# Altium schematic symbol library lib_datalogger.SchLib: 1246 symbols (part 13 of 16) (continued)
## CMP-020-00000-3 (continued)
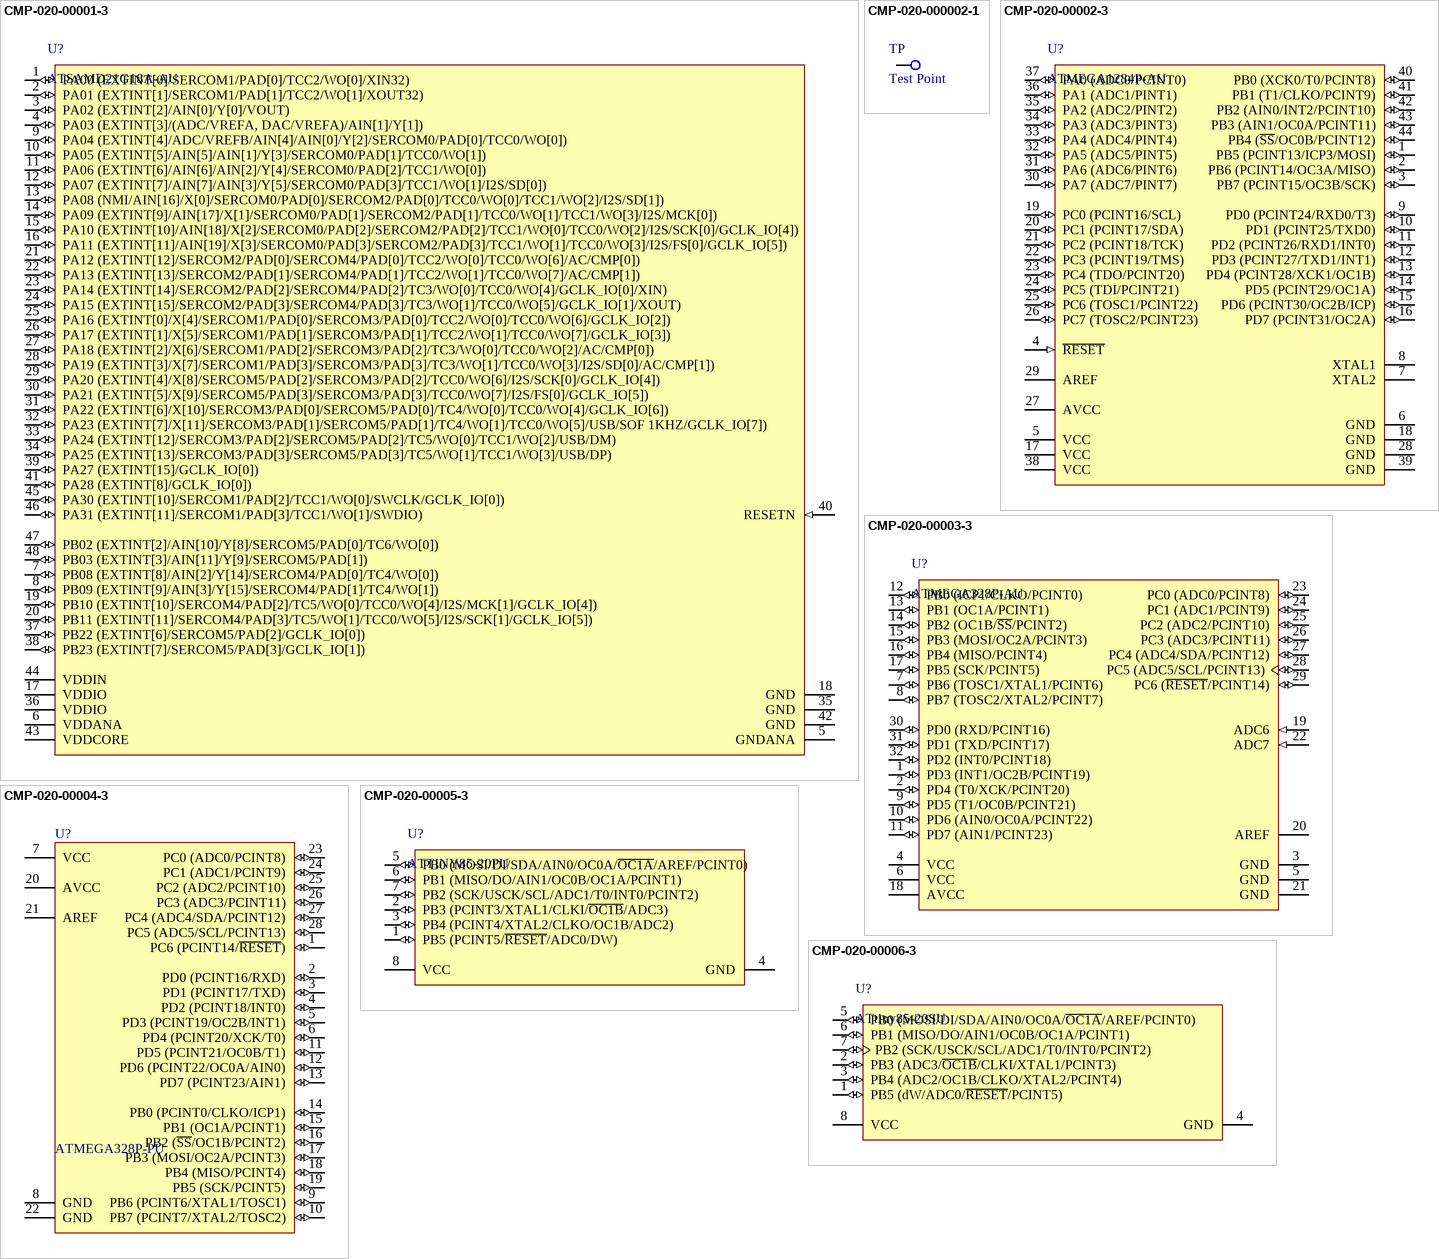
[diagram p37: symbols CMP-020-00001-3 to CMP-020-00006-3]

## CMP-020-00001-3
designator U?, comment ATSAMD21G18A-AU
SMART ARM-Based Microcontroller, 1.62 to 3.63 V, 256 KB Flash, 32 KB SRAM, -40 to 85 degC, 48-Pin TQFP, RoHS, Tray; Manufacturer: Atmel; Interface: USART; I/Os: 38; Max Supply Voltage: 3.63V; Min Supply Voltage: 1.62V; Density: 256KB; RAM Size: 32KB; Package Reference: TQFP48; Datasheet URL: http://www.atmel.com/images/atmel-42181-sam-d21_datasheet.pdf; Mounting Technology: SM; Datasheet Version: Rev. N, 10/2016; Package Description: 48-Pin Thin Profile Plastic Quad Flat Package, Body 7 x 7 mm, Pitch 0.5 mm; Case/Package: TQFP; Pins: 48; Min Operating Temperature: -40°C; Manufacturer URL: http://www.atmel.com/; Packaging: Tray; Max Operating Temperature: 85°C; RoHS Compliant: True
footprint ATML-TQFP48_N (QFP, 48-Leads, Body 7x7mm, Pitch 0.5mm, IPC Medium Density)
footprint ATML-TQFP48_M (QFP, 48-Leads, Body 7x7mm, Pitch 0.5mm, IPC Low Density)
footprint ATML-TQFP48_L (QFP, 48-Leads, Body 7x7mm, Pitch 0.5mm, IPC High Density)
pins: 1 PA00 (EXTINT[0]/SERCOM1/PAD[0]/TCC2/WO[0]/XIN32) (io), 2 PA01 (EXTINT[1]/SERCOM1/PAD[1]/TCC2/WO[1]/XOUT32) (io), 3 PA02 (EXTINT[2]/AIN[0]/Y[0]/VOUT) (io), 4 PA03 (EXTINT[3]/(ADC/VREFA, DAC/VREFA)/AIN[1]/Y[1]) (io), 5 GNDANA (power) "Ground for the analog power domain", 6 VDDANA (power) "Analog supply voltage", 7 PB08 (EXTINT[8]/AIN[2]/Y[14]/SERCOM4/PAD[0]/TC4/WO[0]) (io), 8 PB09 (EXTINT[9]/AIN[3]/Y[15]/SERCOM4/PAD[1]/TC4/WO[1]) (io), 9 PA04 (EXTINT[4]/ADC/VREFB/AIN[4]/AIN[0]/Y[2]/SERCOM0/PAD[0]/TCC0/WO[0]) (io), 10 PA05 (EXTINT[5]/AIN[5]/AIN[1]/Y[3]/SERCOM0/PAD[1]/TCC0/WO[1]) (io), 11 PA06 (EXTINT[6]/AIN[6]/AIN[2]/Y[4]/SERCOM0/PAD[2]/TCC1/WO[0]) (io), 12 PA07 (EXTINT[7]/AIN[7]/AIN[3]/Y[5]/SERCOM0/PAD[3]/TCC1/WO[1]/I2S/SD[0]) (io), 13 PA08 (NMI/AIN[16]/X[0]/SERCOM0/PAD[0]/SERCOM2/PAD[0]/TCC0/WO[0]/TCC1/WO[2]/I2S/SD[1]) (io), 14 PA09 (EXTINT[9]/AIN[17]/X[1]/SERCOM0/PAD[1]/SERCOM2/PAD[1]/TCC0/WO[1]/TCC1/WO[3]/I2S/MCK[0]) (io), 15 PA10 (EXTINT[10]/AIN[18]/X[2]/SERCOM0/PAD[2]/SERCOM2/PAD[2]/TCC1/WO[0]/TCC0/WO[2]/I2S/SCK[0]/GCLK_IO[4]) (io), 16 PA11 (EXTINT[11]/AIN[19]/X[3]/SERCOM0/PAD[3]/SERCOM2/PAD[3]/TCC1/WO[1]/TCC0/WO[3]/I2S/FS[0]/GCLK_IO[5]) (io), 17 VDDIO (power) "Digital supply voltage", 18 GND (power) "Ground", 19 PB10 (EXTINT[10]/SERCOM4/PAD[2]/TC5/WO[0]/TCC0/WO[4]/I2S/MCK[1]/GCLK_IO[4]) (io), 20 PB11 (EXTINT[11]/SERCOM4/PAD[3]/TC5/WO[1]/TCC0/WO[5]/I2S/SCK[1]/GCLK_IO[5]) (io), 21 PA12 (EXTINT[12]/SERCOM2/PAD[0]/SERCOM4/PAD[0]/TCC2/WO[0]/TCC0/WO[6]/AC/CMP[0]) (io), 22 PA13 (EXTINT[13]/SERCOM2/PAD[1]/SERCOM4/PAD[1]/TCC2/WO[1]/TCC0/WO[7]/AC/CMP[1]) (io), 23 PA14 (EXTINT[14]/SERCOM2/PAD[2]/SERCOM4/PAD[2]/TC3/WO[0]/TCC0/WO[4]/GCLK_IO[0]/XIN) (io), 24 PA15 (EXTINT[15]/SERCOM2/PAD[3]/SERCOM4/PAD[3]/TC3/WO[1]/TCC0/WO[5]/GCLK_IO[1]/XOUT) (io), 25 PA16 (EXTINT[0]/X[4]/SERCOM1/PAD[0]/SERCOM3/PAD[0]/TCC2/WO[0]/TCC0/WO[6]/GCLK_IO[2]) (io), 26 PA17 (EXTINT[1]/X[5]/SERCOM1/PAD[1]/SERCOM3/PAD[1]/TCC2/WO[1]/TCC0/WO[7]/GCLK_IO[3]) (io), 27 PA18 (EXTINT[2]/X[6]/SERCOM1/PAD[2]/SERCOM3/PAD[2]/TC3/WO[0]/TCC0/WO[2]/AC/CMP[0]) (io), 28 PA19 (EXTINT[3]/X[7]/SERCOM1/PAD[3]/SERCOM3/PAD[3]/TC3/WO[1]/TCC0/WO[3]/I2S/SD[0]/AC/CMP[1]) (io), 29 PA20 (EXTINT[4]/X[8]/SERCOM5/PAD[2]/SERCOM3/PAD[2]/TCC0/WO[6]/I2S/SCK[0]/GCLK_IO[4]) (io), 30 PA21 (EXTINT[5]/X[9]/SERCOM5/PAD[3]/SERCOM3/PAD[3]/TCC0/WO[7]/I2S/FS[0]/GCLK_IO[5]) (io), 31 PA22 (EXTINT[6]/X[10]/SERCOM3/PAD[0]/SERCOM5/PAD[0]/TC4/WO[0]/TCC0/WO[4]/GCLK_IO[6]) (io), 32 PA23 (EXTINT[7]/X[11]/SERCOM3/PAD[1]/SERCOM5/PAD[1]/TC4/WO[1]/TCC0/WO[5]/USB/SOF 1KHZ/GCLK_IO[7]) (io), 33 PA24 (EXTINT[12]/SERCOM3/PAD[2]/SERCOM5/PAD[2]/TC5/WO[0]/TCC1/WO[2]/USB/DM) (io), 34 PA25 (EXTINT[13]/SERCOM3/PAD[3]/SERCOM5/PAD[3]/TC5/WO[1]/TCC1/WO[3]/USB/DP) (io), 35 GND (power) "Ground", 36 VDDIO (power) "Digital supply voltage", 37 PB22 (EXTINT[6]/SERCOM5/PAD[2]/GCLK_IO[0]) (io), 38 PB23 (EXTINT[7]/SERCOM5/PAD[3]/GCLK_IO[1]) (io), 39 PA27 (EXTINT[15]/GCLK_IO[0]) (io), 40 RESETN (in) "Reset pin", 41 PA28 (EXTINT[8]/GCLK_IO[0]) (io), 42 GND (power) "Ground", 43 VDDCORE (power) "Core supply voltage / external decoupling pin", 44 VDDIN (power), 45 PA30 (EXTINT[10]/SERCOM1/PAD[2]/TCC1/WO[0]/SWCLK/GCLK_IO[0]) (io), 46 PA31 (EXTINT[11]/SERCOM1/PAD[3]/TCC1/WO[1]/SWDIO) (io), 47 PB02 (EXTINT[2]/AIN[10]/Y[8]/SERCOM5/PAD[0]/TC6/WO[0]) (io), 48 PB03 (EXTINT[3]/AIN[11]/Y[9]/SERCOM5/PAD[1]) (io)

## CMP-020-000002-1
designator TP, comment Test Point
Pad Test Point
footprint Test Point-Footprint-1
pins: 1

## CMP-020-00002-3
designator U?, comment ATMEGA1284P-AU
8-Bit Microcontroller with 128 KBytes In-System Programmable Flash, 32 I/Os, -40 to 85 degC, 44-Pin TQFP (44A), RoHS, Tray; Manufacturer: Atmel; Density: 128KB; Frequency: 20MHz; RAM Size: 16KB; PWM Channels: 6; USB Channels: 0; I/Os: 32; Min Supply Voltage: 1.8V; Max Supply Voltage: 5.5V; Interface: USART; ADC Channels: 8; Pins: 8; Manufacturer URL: http://www.atmel.com/; Case/Package: TQFP; Max Operating Temperature: 85°C; Package Description: 44-Pin Quad Flat Package, Body 10 x 10 mm, Pitch 0.8 mm; Mounting Technology: SM; Package Reference: 44A; Min Operating Temperature: -40°C; Clock Frequency: 20MHz; Datasheet Version: Rev. 8272G, 01/2015; Package Quantity: 160; Ethernet Channels: 0; Packaging: Tray; Datasheet URL: http://www.atmel.com/images/atmel-8272-8-bit-avr-microcontroller-atmega164a_pa-324a_pa-644a_pa-1284_p_summary.pdf; Max Clock Frequency: 20MHz; RoHS Compliant: True
footprint ATML-44A_L (TQFP, 44-Leads, Body 10x10mm, Pitch 0.8mm, IPC High Density)
footprint ATML-44A_M (TQFP, 44-Leads, Body 10x10mm, Pitch 0.8mm, IPC Low Density)
footprint ATML-44A_N (TQFP, 44-Leads, Body 10x10mm, Pitch 0.8mm, IPC Medium Density)
pins: 1 PB5 (PCINT13/ICP3/MOSI) (io), 2 PB6 (PCINT14/OC3A/MISO) (io), 3 PB7 (PCINT15/OC3B/SCK) (io), 4 ~{RESET} (in) "Reset input.", 5 VCC (power) "Digital supply voltage.", 6 GND (power) "Ground.", 7 XTAL2 "Output from the inverting Oscillator amplifier.", 8 XTAL1 "Input to the inverting Oscillator amplifier and input to the internal clock operating circuit.", 9 PD0 (PCINT24/RXD0/T3) (io), 10 PD1 (PCINT25/TXD0) (io), 11 PD2 (PCINT26/RXD1/INT0) (io), 12 PD3 (PCINT27/TXD1/INT1) (io), 13 PD4 (PCINT28/XCK1/OC1B) (io), 14 PD5 (PCINT29/OC1A) (io), 15 PD6 (PCINT30/OC2B/ICP) (io), 16 PD7 (PCINT31/OC2A) (io), 17 VCC (power) "Digital supply voltage.", 18 GND (power) "Ground.", 19 PC0 (PCINT16/SCL) (io), 20 PC1 (PCINT17/SDA) (io), 21 PC2 (PCINT18/TCK) (io), 22 PC3 (PCINT19/TMS) (io), 23 PC4 (TDO/PCINT20) (io), 24 PC5 (TDI/PCINT21) (io), 25 PC6 (TOSC1/PCINT22) (io), 26 PC7 (TOSC2/PCINT23) (io), 27 AVCC (power) "AVCC is the supply voltage pin for Port A and the Analog-to-digital Converter.", 28 GND (power) "Ground.", 29 AREF "This is the analog reference pin for the Analog-to-digital Converter.", 30 PA7 (ADC7/PINT7) (io), 31 PA6 (ADC6/PINT6) (io), 32 PA5 (ADC5/PINT5) (io), 33 PA4 (ADC4/PINT4) (io), 34 PA3 (ADC3/PINT3) (io), 35 PA2 (ADC2/PINT2) (io), 36 PA1 (ADC1/PINT1) (io), 37 PA0 (ADC0/PCINT0) (io), 38 VCC (power) "Digital supply voltage.", 39 GND (power) "Ground.", 40 PB0 (XCK0/T0/PCINT8) (io), 41 PB1 (T1/CLKO/PCINT9) (io), 42 PB2 (AIN0/INT2/PCINT10) (io), 43 PB3 (AIN1/OC0A/PCINT11) (io), 44 PB4 (~{SS}/OC0B/PCINT12) (io)

## CMP-020-00003-3
designator U?, comment ATMEGA328P-AU
8-Bit Microcontroller with 32 KBytes In-System Programmable Flash, 23 I/Os, -40 to 85 degC, 32-Pin TQFP (32A), RoHS, Tray; Manufacturer: Atmel; PWM Channels: 6; Frequency: 20MHz; RAM Size: 2KB; ADC Channels: 8; Max Supply Voltage: 5.5V; Density: 32KB; USB Channels: 0; I/Os: 23; Min Supply Voltage: 1.8V; Interface: USART; Package Reference: 32A; Package Description: 32-Pin Thin Profile Plastic Quad Flat Package, Body 7 x 7 mm, Pitch 0.8 mm; Max Operating Temperature: 85°C; Mounting Technology: SM; Datasheet URL: http://www.atmel.com/images/Atmel-8271-8-bit-AVR-Microcontroller-ATmega48A-48PA-88A-88PA-168A-168PA-328-328P_datasheet_Complete.pdf; Pins: 32; Packaging: Tray; RoHS Compliant: True; Max Clock Frequency: 20MHz; Ethernet Channels: 0; Clock Frequency: 20MHz; Case/Package: TQFP; Manufacturer URL: http://www.atmel.com/; Datasheet Version: Rev. 8271J, 11/2015; Package Quantity: 250; Min Operating Temperature: -40°C
footprint ATML-32A_M (TQFP, 32-Leads, Body 7x7mm, Pitch 0.8mm, IPC Low Density)
footprint ATML-32A_N (TQFP, 32-Leads, Body 7x7mm, Pitch 0.8mm, IPC Medium Density)
footprint ATML-32A_L (TQFP, 32-Leads, Body 7x7mm, Pitch 0.8mm, IPC High Density)
pins: 1 PD3 (INT1/OC2B/PCINT19) (io), 2 PD4 (T0/XCK/PCINT20) (io), 3 GND (power) "Ground.", 4 VCC (power) "Digital supply voltage.", 5 GND (power) "Ground.", 6 VCC (power) "Digital supply voltage.", 7 PB6 (TOSC1/XTAL1/PCINT6) (io), 8 PB7 (TOSC2/XTAL2/PCINT7) (io), 9 PD5 (T1/OC0B/PCINT21) (io), 10 PD6 (AIN0/OC0A/PCINT22) (io), 11 PD7 (AIN1/PCINT23) (io), 12 PB0 (ICP1/CLKO/PCINT0) (io), 13 PB1 (OC1A/PCINT1) (io), 14 PB2 (OC1B/~{SS}/PCINT2) (io), 15 PB3 (MOSI/OC2A/PCINT3) (io), 16 PB4 (MISO/PCINT4) (io), 17 PB5 (SCK/PCINT5) (io), 18 AVCC (power) "AVCC is the supply voltage pin for the A/D Converter, PC3:0, and ADC7:6. It should be externally connected to VCC, even if the ADC is not used. If the ADC is used, it should be connected to VCC through a low-pass filter. (See Datasheet)", 19 ADC6 (in) "In the TQFP and QFN/MLF package, ADC7:6 serve as analog inputs to the A/D converter.These pins are powered from the analog supply and serve as 10-bit ADC channels.", 20 AREF "AREF is the analog reference pin for the A/D Converter.", 21 GND (power) "Ground.", 22 ADC7 (in) "In the TQFP and QFN/MLF package, ADC7:6 serve as analog inputs to the A/D converter.These pins are powered from the analog supply and serve as 10-bit ADC channels.", 23 PC0 (ADC0/PCINT8) (io), 24 PC1 (ADC1/PCINT9) (io), 25 PC2 (ADC2/PCINT10) (io), 26 PC3 (ADC3/PCINT11) (io), 27 PC4 (ADC4/SDA/PCINT12) (io), 28 PC5 (ADC5/SCL/PCINT13) (io), 29 PC6 (~{RESET}/PCINT14) (io), 30 PD0 (RXD/PCINT16) (io), 31 PD1 (TXD/PCINT17) (io), 32 PD2 (INT0/PCINT18) (io)

## CMP-020-00004-3
designator U?, comment ATMEGA328P-PU
8-Bit Microcontroller with 32 KBytes In-System Programmable Flash, 23 I/Os, -40 to 85 degC, 28-Pin PDIP (28P3), RoHS, Tube; Manufacturer: Atmel; I/Os: 23; Density: 32KB; Package Version: Rev. B, 09/2001; Max Clock Frequency: 20MHz; Interface: USART; Max Supply Voltage: 5.5V; Min Supply Voltage: 1.8V; Ethernet Channels: 0; RAM Size: 2KB; RoHS Compliant: True; Datasheet URL: http://www.atmel.com/images/Atmel-8271-8-bit-AVR-Microcontroller-ATmega48A-48PA-88A-88PA-168A-168PA-328-328P_datasheet_Complete.pdf; Packaging: Rail/Tube; Manufacturer URL: http://www.atmel.com/; Mounting Technology: TH; Package URL: http://www.atmel.com/images/Atmel-8271-8-bit-AVR-Microcontroller-ATmega48A-48PA-88A-88PA-168A-168PA-328-328P_datasheet_Complete.pdf; Datasheet Version: Rev. 8271J, 11/2015; Package Description: 28-Pin Plastic Dual Inline Package, Body 34.671 x 7.3025 mm, Pitch 2.54 mm; Package Quantity: 14; Min Operating Temperature: -40°C; Max Operating Temperature: 85°C; Case/Package: DIP; Pins: 28; Package Reference: 28P3
footprint ATML-28P3 (DIP, 28-Leads, Body 34.8x7.2mm, Pitch 2.54mm)
pins: 1 PC6 (PCINT14/~{RESET}) (io), 2 PD0 (PCINT16/RXD) (io), 3 PD1 (PCINT17/TXD) (io), 4 PD2 (PCINT18/INT0) (io), 5 PD3 (PCINT19/OC2B/INT1) (io), 6 PD4 (PCINT20/XCK/T0) (io), 7 VCC (power), 8 GND (power), 9 PB6 (PCINT6/XTAL1/TOSC1) (io), 10 PB7 (PCINT7/XTAL2/TOSC2) (io), 11 PD5 (PCINT21/OC0B/T1) (io), 12 PD6 (PCINT22/OC0A/AIN0) (io), 13 PD7 (PCINT23/AIN1) (io), 14 PB0 (PCINT0/CLKO/ICP1) (io), 15 PB1 (OC1A/PCINT1) (io), 16 PB2 (~{SS}/OC1B/PCINT2) (io), 17 PB3 (MOSI/OC2A/PCINT3) (io), 18 PB4 (MISO/PCINT4) (io), 19 PB5 (SCK/PCINT5) (io), 20 AVCC (power), 21 AREF (power), 22 GND (power), 23 PC0 (ADC0/PCINT8) (io), 24 PC1 (ADC1/PCINT9) (io), 25 PC2 (ADC2/PCINT10) (io), 26 PC3 (ADC3/PCINT11) (io), 27 PC4 (ADC4/SDA/PCINT12) (io), 28 PC5 (ADC5/SCL/PCINT13) (io)

## CMP-020-00005-3
designator U?, comment ATTINY85-20PU
8-bit AVR(R) Microcontroller with 8 KBytes In-System Programmable Flash, 2.7 to 5.5 V, -40 to 85 degC, 8-Pin DIP, Pb-Free; Manufacturer: Atmel; Frequency: 20MHz; Max Supply Voltage: 5.5V; Density: 8KB; UART Channels: 1; USB Channels: 0; I/Os: 6; RAM Size: 512B; Interface: SPI; ADC Channels: 4; Min Supply Voltage: 2.7V; Package Version: Rev. E, 07/2014; Max Operating Temperature: 85°C; Package Description: 8-Pin Plastic Dual Inline Package, Body 9.271 x 6.35 mm, Pitch 2.54 mm; Pins: 8; Min Operating Temperature: -40°C; Manufacturer URL: http://www.atmel.com/; Packaging: Rail/Tube; Package Quantity: 50; Datasheet Version: Rev. 2586K, 01/2008; Max Clock Frequency: 20MHz; Package URL: http://www.atmel.com/Images/doc2535.pdf; PWM Channels: 6; Datasheet URL: https://datasheet.ciiva.com/20168/73-5122-20168321.pdf; Mounting Technology: TH; RoHS Compliant: True; Package Reference: 8P3; Case/Package: DIP
footprint ATML-8P3 (DIP, 8-Leads, Body 10.15x7.1mm, Pitch 2.54mm)
pins: 1 PB5 (PCINT5/~{RESET}/ADC0/DW) (io), 2 PB3 (PCINT3/XTAL1/CLKI/~{OC1B}/ADC3) (io), 3 PB4 (PCINT4/XTAL2/CLKO/OC1B/ADC2) (io), 4 GND (power), 5 PB0 (MOSI/DI/SDA/AIN0/OC0A/~{OC1A}/AREF/PCINT0) (io), 6 PB1 (MISO/DO/AIN1/OC0B/OC1A/PCINT1) (io), 7 PB2 (SCK/USCK/SCL/ADC1/T0/INT0/PCINT2) (io), 8 VCC (power)

## CMP-020-00006-3
designator U?, comment ATtiny85-20SU
8-bit AVR Microcontroller with In-System Programmable Flash, 2.7 to 5.5 V, 20 MHz, 8 KB Flash, 0.5 KB EEPROM, 0.5 KB SRAM, -40 to 85 degC, 8-Pin SOIC (8S2), RoHS, Tube; Manufacturer: Atmel; ADC Channels: 4; Max Supply Voltage: 5.5V; PWM Channels: 6; UART Channels: 1; Interface: SPI; USB Channels: 0; Min Supply Voltage: 2.7V; Frequency: 20MHz; RAM Size: 512B; Density: 8KB; Datasheet Version: Rev. 2586Q, 08/2013; Package Quantity: 95; RoHS Compliant: True; Manufacturer URL: http://www.atmel.com/; Datasheet URL: http://www.atmel.com/Images/Atmel-2586-AVR-8-bit-Microcontroller-ATtiny25-ATtiny45-ATtiny85_Datasheet.pdf; Package Description: 8-Pin Small Outline Integrated Circuit Package, Body 5.29 x 5.24 mm, Pitch 1.27 mm; Mounting Technology: SM; Max Operating Temperature: 85°C; Case/Package: SOIC; I/Os: 6; Max Clock Frequency: 20MHz; Packaging: Rail/Tube; Min Operating Temperature: -40°C; Pins: 8; Package Reference: 8S2
footprint ATML-8S2_L (SOIC, 8-Leads, Body 5.4x5.4mm, Pitch 1.27mm, IPC High Density)
footprint ATML-8S2_M (SOIC, 8-Leads, Body 5.4x5.4mm, Pitch 1.27mm, IPC Low Density)
footprint ATML-8S2_N (SOIC, 8-Leads, Body 5.4x5.4mm, Pitch 1.27mm, IPC Medium Density)
pins: 1 PB5 (dW/ADC0/~{RESET}/PCINT5) (io), 2 PB3 (ADC3/~{OC1B}/CLKI/XTAL1/PCINT3) (io), 3 PB4 (ADC2/OC1B/CLKO/XTAL2/PCINT4) (io), 4 GND (power) "Ground.", 5 PB0 (MOSI/DI/SDA/AIN0/OC0A/~{OC1A}/AREF/PCINT0) (io), 6 PB1 (MISO/DO/AIN1/OC0B/OC1A/PCINT1) (io), 7 PB2 (SCK/USCK/SCL/ADC1/T0/INT0/PCINT2) (io), 8 VCC (power) "Supply voltage."

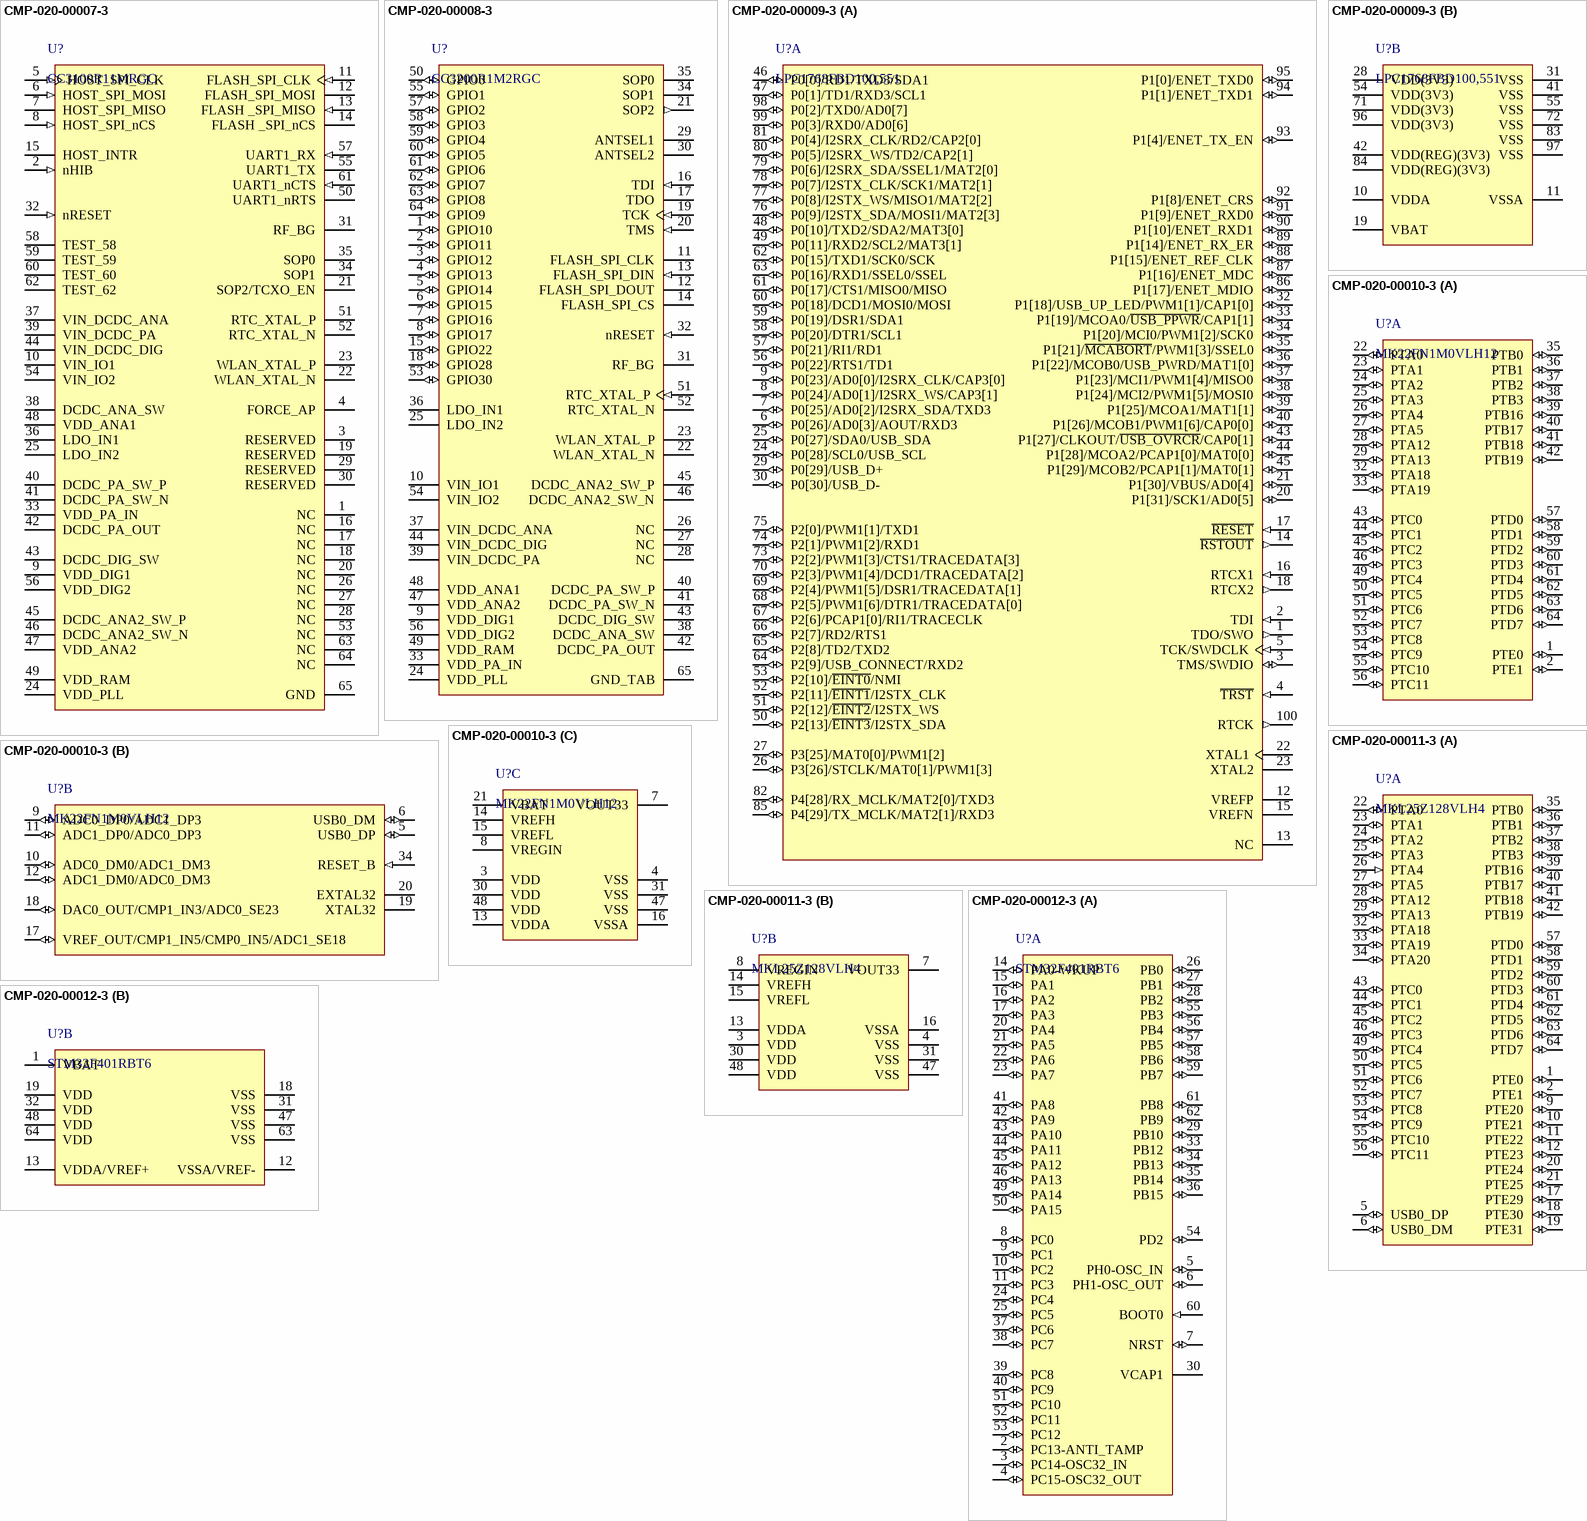
[diagram p38: symbols CMP-020-00007-3 to CMP-020-00012-3]

## CMP-020-00007-3
designator U?, comment CC3100R11MRGC
SimpleLink(TM) Wi-Fi(R) Network Processor, Internet-of-Things Solution for MCU Application, 2.1 to 3.6 V, -40 to 85 degC, 64-Pin VQFN (RGC), Green (RoHS & no Sb/Br), Tray; Manufacturer: Texas Instruments; Max Supply Voltage: 3.6V; Min Supply Voltage: 2.1V; RoHS Compliant: True; Datasheet URL: http://www.ti.com/lit/ds/symlink/cc3100.pdf; Datasheet Version: SWAS031D, 02/2015; Packaging: CutTape; Pins: 64; Case/Package: RGC0064H; Mounting Technology: SM; Package Reference: RGC0064H; Min Operating Temperature: -40°C; Package Description: 64-Pin Quad Flat No-lead Package, Body 9 x 9 mm, Pitch 0.5 mm, Thermal Pad 7.3 x7.3 mm; Max Operating Temperature: 85°C; Manufacturer URL: http://www.ti.com/
footprint RGC0064H_V (QFN, 64-Leads, Body 9x9mm, Pitch 0.5mm, Thermal Pad 7.4x7.4mm, TI Recommend)
pins: 1 NC "Unused; leave unconnected.", 2 nHIB (in) "Hibernate signal input to the NWP (active low). This is connected to the MCU GPIO. If the GPIO from the MCU can float while the MCU enters low power, consider adding a pull-up resistor on the board to avoid floating.", 3 RESERVED "Reserved for future use", 4 FORCE_AP "For forced AP mode, pull to high on the board using 100k resistor. Otherwise, pull down to ground using 100k resistor.(1)", 5 HOST_SPI_CLK (in) "Host interface SPI clock", 6 HOST_SPI_MOSI (in) "Host interface SPI data input", 7 HOST_SPI_MISO "Host interface SPI data output", 8 HOST_SPI_nCS (in) "Host interface SPI chip selec", 9 VDD_DIG1 (power) "Digital core supply", 10 VIN_IO1 (power) "I/O supply", 11 FLASH_SPI_CLK (in) "Serial flash interface: SPI clock", 12 FLASH_SPI_MOSI "Serial flash interface: SPI data out", 13 FLASH _SPI_MISO (in) "Serial flash interface: SPI data in", 14 FLASH _SPI_nCS "Serial flash interface: SPI chip select (active low)", 15 HOST_INTR (hiz) "Interrupt output (active high)", 16 NC "Unused; leave unconnected.", 17 NC "Unused; leave unconnected.", 18 NC "Unused; leave unconnected.", 19 RESERVED "Connect 100K pull-down to ground.", 20 NC "Unused; leave unconnected.", 21 SOP2/TCXO_EN "Enable signal for external TCXO. Add 10k pulldown to ground.", 22 WLAN_XTAL_N "Connect the WLAN 40-MHz XTAL here.", 23 WLAN_XTAL_P "Connect the WLAN 40-MHz XTAL here.", 24 VDD_PLL (power) "Internal PLL power supply (1.4 V nominal)", 25 LDO_IN2 (power) "Input to internal LDO", 26 NC "Unused; leave unconnected.", 27 NC "Unused; leave unconnected.", 28 NC "Unused; leave unconnected.", 29 RESERVED "Reserved for future use", 30 RESERVED "Reserved for future use", 31 RF_BG "2.4-GHz RF TX/RX", 32 nRESET (in) "RESET input for the device. Active low input. Use RC circuit (100k || 0.1 uF) for power on reset.", 33 VDD_PA_IN (power) "Power supply for the RF power amplifier (PA)", 34 SOP1 "Add 100K pulldown to ground.", 35 SOP0 "Add 100K pulldown to ground.", 36 LDO_IN1 (power) "Input to internal LDO", 37 VIN_DCDC_ANA (power) "Power supply for the DC-DC converter for analog section", 38 DCDC_ANA_SW (power) "Analog DC-DC converter switch output", 39 VIN_DCDC_PA (power) "PA DC-DC converter input supply", 40 DCDC_PA_SW_P (power) "PA DC-DC converter switch output +ve", 41 DCDC_PA_SW_N (power) "PA DC-DC converter switch output -ve", 42 DCDC_PA_OUT (power) "PA DC-DC converter output. Connect the output capacitor for DC-DC here.", 43 DCDC_DIG_SW (power) "Digital DC-DC converter switch output", 44 VIN_DCDC_DIG (power) "Power supply input for the digital DC-DC converter", 45 DCDC_ANA2_SW_P (power) "Analog2 DC-DC converter switch output +ve", 46 DCDC_ANA2_SW_N (power) "Analog2 DC-DC converter switch output -ve", 47 VDD_ANA2 (power) "Analog2 power supply input", 48 VDD_ANA1 (power) "Analog1 power supply input", 49 VDD_RAM (power) "Power supply for the internal RAM", 50 UART1_nRTS "UART host interface", 51 RTC_XTAL_P "32.768 kHz XTAL_P/external CMOS level clock input", 52 RTC_XTAL_N "32.768 kHz XTAL_N/100k external pullup for external clock", 53 NC "Unused. Leave unconnected.", 54 VIN_IO2 (power) "I/O power supply. Same as battery voltage.", 55 UART1_TX "UART host interface. Connect to test point on prototype for flash programming.", 56 VDD_DIG2 (power) "Digital power supply (1.2 V)", 57 UART1_RX (in) "UART host interface. Connect to test point on prototype for flash programming.", 58 TEST_58 "Test signal. Connect to an external test point", 59 TEST_59 "Test signal. Connect to an external test point.", 60 TEST_60 "Test signal. Connect to an external test point.", 61 UART1_nCTS (in) "UART host interface", 62 TEST_62 "Test signal. Connect to an external test point.", 63 NC "Leave unconnected", 64 NC "Leave unconnected", 65 GND (power) "Ground tab used as thermal and electrical ground"

## CMP-020-00008-3
designator U?, comment CC3200R1M2RGC
SimpleLink Wi-Fi and Internet-of-Things Solution, A Single-Chip Wireless MCU, 2.1 to 3.6 V, -40 to 85 degC, 64-Pin PQFN (RGC64), Green (RoHS & no Sb/Br), Tray; Manufacturer: Texas Instruments; RAM Size: 256KB; Min Operating Temperature: -40°C; Manufacturer URL: http://www.ti.com/; RoHS Compliant: True; Datasheet URL: http://www.ti.com/lit/ds/symlink/cc3200.pdf; Max Operating Temperature: 85°C; Package URL: http://www.ti.com/lit/ml/mpqf125e/mpqf125e.pdf; Case/Package: RGC64; Package Reference: RGC64; Datasheet Version: SWAS032F, 02/2015; Packaging: Tray
footprint TI-RGC64-7300x7300TP_N (QFN, 64-Leads, Body 9.15x9.15mm, Pitch 0.50mm, Thermal Pad 7.30x7.30mm, IPC Medium Density)
footprint TI-RGC64-7300x7300TP_M (QFN, 64-Leads, Body 9.15x9.15mm, Pitch 0.50mm, Thermal Pad 7.30x7.30mm, IPC Low Density)
footprint TI-RGC64-7300x7300TP_L (QFN, 64-Leads, Body 9.15x9.15mm, Pitch 0.50mm, Thermal Pad 7.30x7.30mm, IPC High Density)
pins: 1 GPIO10 (io) "General-Purpose  I/O", 2 GPIO11 (io) "General-Purpose  I/O", 3 GPIO12 (io) "General Purpose  I/O", 4 GPIO13 (io) "General Purpose  I/O", 5 GPIO14 (io) "General Purpose  I/O", 6 GPIO15 (io) "General Purpose  I/O", 7 GPIO16 (io) "General Purpose  I/O", 8 GPIO17 (io) "General Purpose  I/O", 9 VDD_DIG1 (power) "Internal Digital Core Voltage", 10 VIN_IO1 (power) "Chip Supply  Voltage (VBAT)", 11 FLASH_SPI_CLK (hiz) "Clock To SPI  Serial Flash  (Fixed Default)", 12 FLASH_SPI_DOUT (hiz) "Data To SPI  Serial Flash  (Fixed Default)", 13 FLASH_SPI_DIN (in) "Data From SPI  Serial Flash  (Fixed Default)", 14 FLASH_SPI_CS (hiz) "Chip Select To  SPI Serial Flash  (Fixed Default)", 15 GPIO22 (io) "General Purpose  I/O", 16 TDI (in) "JTAG TDI. Reset  Default Pinout.", 17 TDO (hiz) "JTAG TDO.  Reset Default  Pinout.", 18 GPIO28 (io) "General Purpose  I/O", 19 TCK (in) "JTAG/SWD TCK  Reset Default  Pinout", 20 TMS (in) "JATG/SWD TMS  Reset Default  Pinout", 21 SOP2 (out) "Sense-On-Power  2", 22 WLAN_XTAL_N "40-MHz XTAL  Pulldown if ext TCXO is used.", 23 WLAN_XTAL_P "40-MHz XTAL or  TCXO clock input", 24 VDD_PLL (power) "Internal analog voltage", 25 LDO_IN2 (power) "Analog RF  supply from ANA  DC-DC output", 26 NC "Reserved", 27 NC "Reserved", 28 NC "Reserved", 29 ANTSEL1 (hiz) "Antenna  Selection Control", 30 ANTSEL2 (hiz) "Antenna  Selection Control", 31 RF_BG "RF BG band", 32 nRESET (in) "Master chip  reset. Active low.", 33 VDD_PA_IN (power) "PA supply  voltage from PA  DC-DC output.", 34 SOP1 "Sense On Power  1", 35 SOP0 "Sense On Power  0", 36 LDO_IN1 (power) "Analog RF  supply from ana DC-DC output", 37 VIN_DCDC_ANA (power) "Analog DC-DC  input (connected  to chip input  supply [VBAT])", 38 DCDC_ANA_SW (power) "Analog DC-DC  switching node.", 39 VIN_DCDC_PA (power) "PA DC-DC input  (connected to  chip input supply  [VBAT])", 40 DCDC_PA_SW_P (power) "PA DCDC  switching node", 41 DCDC_PA_SW_N (power) "PA DCDC  switching node", 42 DCDC_PA_OUT (power) "PA buck  converter output", 43 DCDC_DIG_SW (power) "DIG DC-DC  switching node", 44 VIN_DCDC_DIG (power) "DIG DC-DC input  (connected to  chip input supply  [VBAT])", 45 DCDC_ANA2_SW_P "ANA2 DCDC  Converter +ve  Switching Node.", 46 DCDC_ANA2_SW_N "ANA2 DCDC  Converter -ve Switching Node.", 47 VDD_ANA2 (power) "ANA2 DCDC O", 48 VDD_ANA1 (power) "Analog supply  fed by ANA2 DCDC output", 49 VDD_RAM (power) "SRAM LDO  output", 50 GPIO0 (io) "General-Purpose  I/O", 51 RTC_XTAL_P (in) "Connect 32.768-  kHz XTAL or  Froce external CMOS level  clock", 52 RTC_XTAL_N "Connect 32.768-  kHz XTAL or connect a 100 kohm  to Vsupply.", 53 GPIO30 (io) "General-Purpose  I/O", 54 VIN_IO2 (power) "Chip Supply  Voltage (VBAT)", 55 GPIO1 (io) "General-Purpose  I/O", 56 VDD_DIG2 (power) "Internal Digital  Core Voltage", 57 GPIO2 (io) "General-Purpose  I/O", 58 GPIO3 (io) "General-Purpose  I/O", 59 GPIO4 (io) "General-Purpose  I/O", 60 GPIO5 (io) "General-Purpose  I/O", 61 GPIO6 (io) "General-Purpose  I/O", 62 GPIO7 (io) "General-Purpose  I/O", 63 GPIO8 (io) "General-Purpose  I/O", 64 GPIO9 (io) "General-Purpose  I/O", 65 GND_TAB (power) "Thermal pad and  electrical ground"

## CMP-020-00009-3
designator U?, comment LPC1768FBD100,551
32-Bit ARM Cortex-M3 Microcontroller, Ethernet, USB 2.0 Host/Device/OTG, CAN, 512 KB Flash, 64 KB SRAM, -40 to 85 degC, 100-Pin LQFP (SOT407-1), RoHS, Tray; Manufacturer: NXP; Density: 512KB; PWM Channels: 7; I/Os: 70; Frequency: 100MHz; Power: 1.5W; RAM Size: 64KB; Min Supply Voltage: 2.4V; UART Channels: 4; Max Supply Voltage: 3.6V; Nominal Supply Voltage: 3.3V; ADC Channels: 8; Ethernet Channels: 1; Interface: UART; Package Reference: SOT407-1; Datasheet URL: http://www.nxp.com/documents/data_sheet/LPC1769_68_67_66_65_64_63.pdf; Case/Package: LQFP; RoHS Compliant: True; Package Quantity: 90; Max Clock Frequency: 100MHz; Package URL: http://www.nxp.com/documents/; Pins: 100; Package Description: 100-Pin Plastic Low Profile Quad Flat Package, Body 14 x 14 mm; Mounting Technology: SM; Datasheet Version: Rev. 9.6 , 08/2015; Manufacturer URL: http://www.nxp.com/; Min Operating Temperature: -40°C; Max Operating Temperature: 85°C; Packaging: Tray
footprint NXP-SOT407-1_V (QFP, 100-Leads, Body 14x14mm)
part A pins: 1 TDO/SWO (out), 2 TDI (in), 3 TMS/SWDIO (io), 4 ~{TRST} (in), 5 TCK/SWDCLK (in), 6 P0[26]/AD0[3]/AOUT/RXD3 (io), 7 P0[25]/AD0[2]/I2SRX_SDA/TXD3 (io), 8 P0[24]/AD0[1]/I2SRX_WS/CAP3[1] (io), 9 P0[23]/AD0[0]/I2SRX_CLK/CAP3[0] (io), 12 VREFP, 13 NC, 14 ~{RSTOUT} (out), 15 VREFN, 16 RTCX1 (in), 17 ~{RESET} (in), 18 RTCX2 (out), 20 P1[31]/SCK1/AD0[5] (io), 21 P1[30]/VBUS/AD0[4] (io), 22 XTAL1, 23 XTAL2, 24 P0[28]/SCL0/USB_SCL (io), 25 P0[27]/SDA0/USB_SDA (io), 26 P3[26]/STCLK/MAT0[1]/PWM1[3] (io), 27 P3[25]/MAT0[0]/PWM1[2] (io), 29 P0[29]/USB_D+ (io), 30 P0[30]/USB_D- (io), 32 P1[18]/USB_UP_LED/PWM1[1]/CAP1[0] (io), 33 P1[19]/MCOA0/~{USB_PPWR}/CAP1[1] (io), 34 P1[20]/MCI0/PWM1[2]/SCK0 (io), 35 P1[21]/~{MCABORT}/PWM1[3]/SSEL0 (io), 36 P1[22]/MCOB0/USB_PWRD/MAT1[0] (io), 37 P1[23]/MCI1/PWM1[4]/MISO0 (io), 38 P1[24]/MCI2/PWM1[5]/MOSI0 (io), 39 P1[25]/MCOA1/MAT1[1] (io), 40 P1[26]/MCOB1/PWM1[6]/CAP0[0] (io), 43 P1[27]/CLKOUT/~{USB_OVRCR}/CAP0[1] (io), 44 P1[28]/MCOA2/PCAP1[0]/MAT0[0] (io), 45 P1[29]/MCOB2/PCAP1[1]/MAT0[1] (io), 46 P0[0]/RD1/TXD3/SDA1 (io), 47 P0[1]/TD1/RXD3/SCL1 (io), 48 P0[10]/TXD2/SDA2/MAT3[0] (io), 49 P0[11]/RXD2/SCL2/MAT3[1] (io), 50 P2[13]/~{EINT3}/I2STX_SDA (io), 51 P2[12]/~{EINT2}/I2STX_WS (io), 52 P2[11]/~{EINT1}/I2STX_CLK (io), 53 P2[10]/~{EINT0}/NMI (io), 56 P0[22]/RTS1/TD1 (io), 57 P0[21]/RI1/RD1 (io), 58 P0[20]/DTR1/SCL1 (io), 59 P0[19]/DSR1/SDA1 (io), 60 P0[18]/DCD1/MOSI0/MOSI (io), 61 P0[17]/CTS1/MISO0/MISO (io), 62 P0[15]/TXD1/SCK0/SCK (io), 63 P0[16]/RXD1/SSEL0/SSEL (io), 64 P2[9]/USB_CONNECT/RXD2 (io), 65 P2[8]/TD2/TXD2 (io), 66 P2[7]/RD2/RTS1 (io), 67 P2[6]/PCAP1[0]/RI1/TRACECLK (io), 68 P2[5]/PWM1[6]/DTR1/TRACEDATA[0] (io), 69 P2[4]/PWM1[5]/DSR1/TRACEDATA[1] (io), 70 P2[3]/PWM1[4]/DCD1/TRACEDATA[2] (io), 73 P2[2]/PWM1[3]/CTS1/TRACEDATA[3] (io), 74 P2[1]/PWM1[2]/RXD1 (io), 75 P2[0]/PWM1[1]/TXD1 (io), 76 P0[9]/I2STX_SDA/MOSI1/MAT2[3] (io), 77 P0[8]/I2STX_WS/MISO1/MAT2[2] (io), 78 P0[7]/I2STX_CLK/SCK1/MAT2[1] (io), 79 P0[6]/I2SRX_SDA/SSEL1/MAT2[0] (io), 80 P0[5]/I2SRX_WS/TD2/CAP2[1] (io), 81 P0[4]/I2SRX_CLK/RD2/CAP2[0] (io), 82 P4[28]/RX_MCLK/MAT2[0]/TXD3 (io), 85 P4[29]/TX_MCLK/MAT2[1]/RXD3 (io), 86 P1[17]/ENET_MDIO (io), 87 P1[16]/ENET_MDC (io), 88 P1[15]/ENET_REF_CLK (io), 89 P1[14]/ENET_RX_ER (io), 90 P1[10]/ENET_RXD1 (io), 91 P1[9]/ENET_RXD0 (io), 92 P1[8]/ENET_CRS (io), 93 P1[4]/ENET_TX_EN (io), 94 P1[1]/ENET_TXD1 (io), 95 P1[0]/ENET_TXD0 (io), 98 P0[2]/TXD0/AD0[7] (io), 99 P0[3]/RXD0/AD0[6] (io), 100 RTCK (out)
part B pins: 10 VDDA (power), 11 VSSA (power), 19 VBAT (power), 28 VDD(3V3) (power), 31 VSS (power), 41 VSS (power), 42 VDD(REG)(3V3) (power), 54 VDD(3V3) (power), 55 VSS (power), 71 VDD(3V3) (power), 72 VSS (power), 83 VSS (power), 84 VDD(REG)(3V3) (power), 96 VDD(3V3) (power), 97 VSS (power)